# Altium schematic symbol library lib_datalogger.SchLib: 1246 symbols (part 2 of 16)
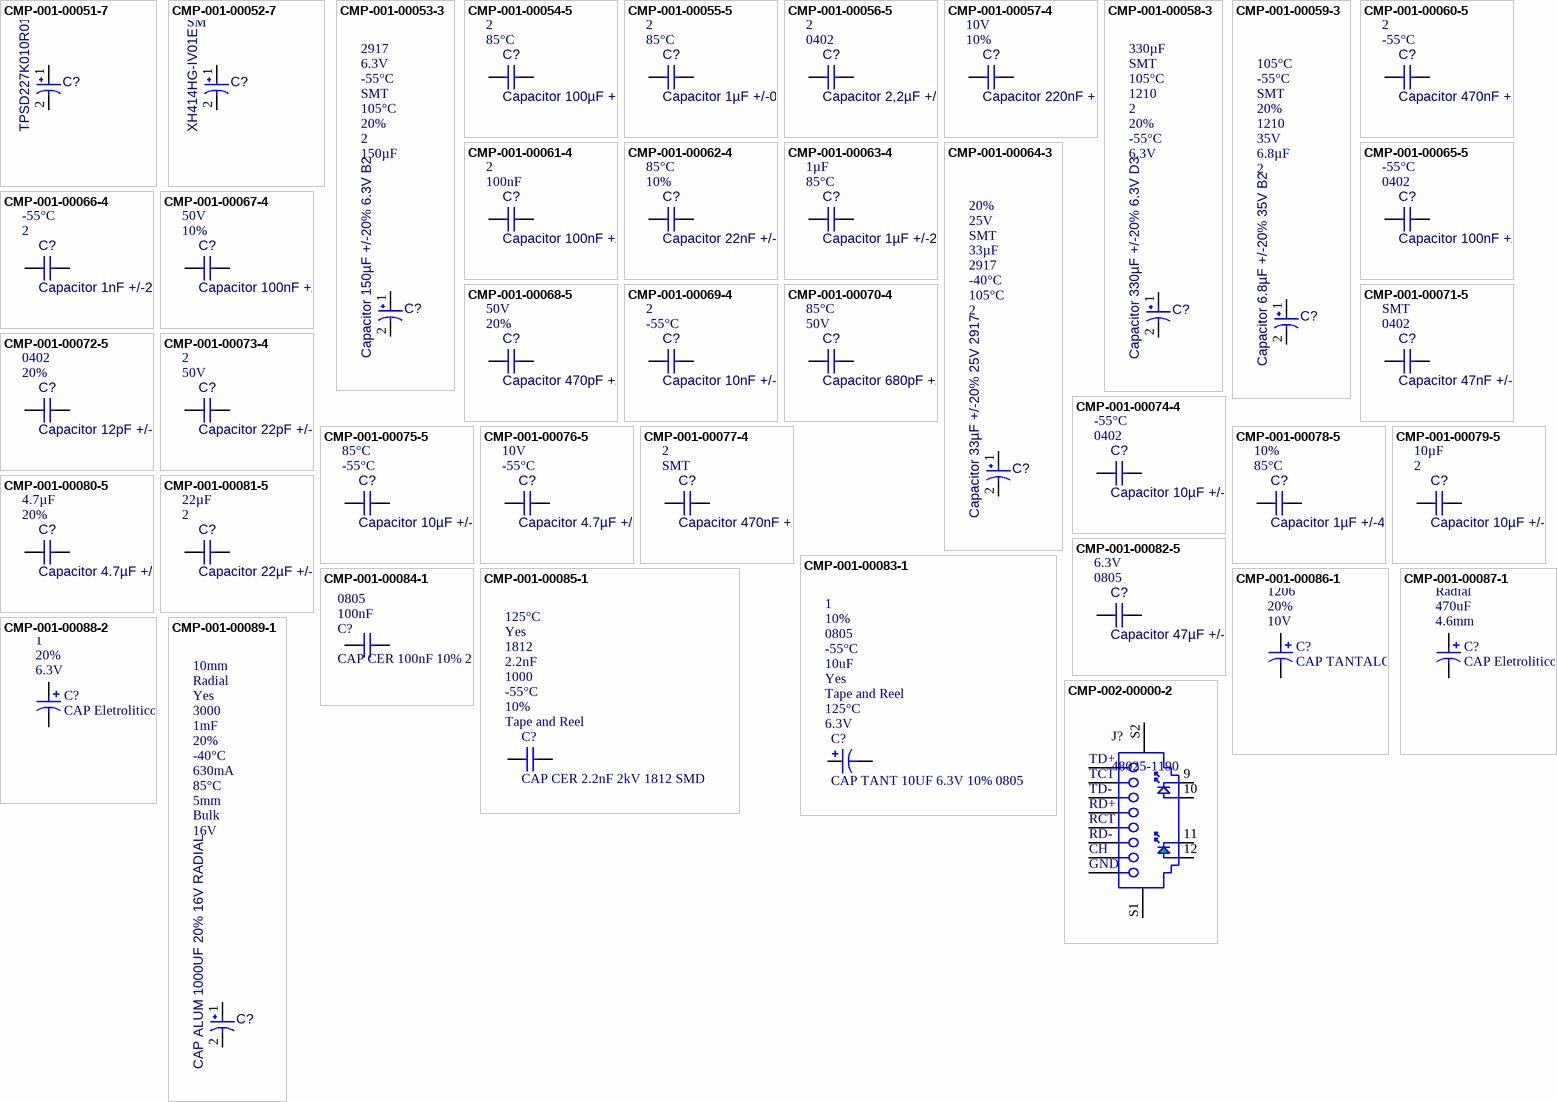
[diagram p44: symbols CMP-001-00051-7 to CMP-002-00000-2]

## CMP-001-00053-3
designator C?, comment Capacitor 150µF +/-20% 6.3V B2  value 150µF  Pins: 2  Tolerance: 20%  Max Operating Temperature: 105°C  Mounting Technology: SMT  Min Operating Temperature: -55°C  Voltage Rating: 6.3V  Case/Package: 2917
Molded Tantalum Polymer Capacitor, 150 uF, +/- 20%, 6.3 V, -55 to 105 degC, 2-Pin SMD, RoHS, Tape and Reel
footprint EEF-CX1E330R-Footprint-1
footprint PNSC-6TPE150MAZB_L (Molded Capacitor, 2-Leads, Body 3.70x3mm, IPC High Density)
pins: 1, 2

## CMP-001-00054-5
designator C?, comment Capacitor 100µF +/-20% 6.3V 0805  value 100µF  Max Operating Temperature: 85°C  Pins: 2  Tolerance: 10%  Min Operating Temperature: -55°C  Case/Package: 0805  Voltage Rating: 6.3V  Mounting Technology: SMT
Chip Capacitor, 100µF +/-20%, 6.3V, 0805, Thickness 1.45 mm
footprint CAPC0603(1608)100_L (Chip Capacitor, Body 1.6x0.8mm, Height 1.0mm, IPC High Density)
footprint CAPC0805(2012)145_L (Chip Capacitor, Body 2.0x1.2mm, Height 1.45mm, IPC High Density)
pins: 1, 2

## CMP-001-00055-5
designator C?, comment Capacitor 1µF +/-0.1% 25V 0603  value 1µF  Max Operating Temperature: 85°C  Pins: 2  Tolerance: 20%  Case/Package: 0603  Voltage Rating: 25V  Min Operating Temperature: -55°C  Mounting Technology: SMT
Chip Capacitor, 1µF +/-0.1%, 25V, 0603, Thickness 1 mm
footprint CAPC0603(1608)100_L (Chip Capacitor, Body 1.6x0.8mm, Height 1.0mm, IPC High Density)
footprint CAPC0603(1608)100_L (Chip Capacitor, Body 1.6x0.8mm, Height 1.0mm, IPC High Density)
pins: 1, 2

## CMP-001-00056-5
designator C?, comment Capacitor 2,2µF +/-20% 10V 0402  value 2.2µF  Case/Package: 0402  Pins: 2  Voltage Rating: 10V  Mounting Technology: SMT  Tolerance: 10%  Max Operating Temperature: 85°C  Min Operating Temperature: -55°C
Chip Capacitor, 2,2µF +/-20%, 10V, 0402, Thickness 0.6 mm
footprint CAPC0603(1608)100_L (Chip Capacitor, Body 1.6x0.8mm, Height 1.0mm, IPC High Density)
footprint CAPC0402(1005)60_L (Chip Capacitor, Body 1.0x0.5mm, Height 0.6mm, IPC High Density)
pins: 1, 2

## CMP-001-00057-4
designator C?, comment Capacitor 220nF +/-20% 10V 0402  value 220nF  Tolerance: 10%  Voltage Rating: 10V  Mounting Technology: SMT  Case/Package: 0402  Max Operating Temperature: 85°C  Min Operating Temperature: -55°C  Pins: 2
Chip Capacitor, 220nF +/-20%, 10V, 0402, Thickness 0.6 mm
footprint CAPC0603(1608)100_L (Chip Capacitor, Body 1.6x0.8mm, Height 1.0mm, IPC High Density)
footprint CAPC0402(1005)60_L (Chip Capacitor, Body 1.0x0.5mm, Height 0.6mm, IPC High Density)
pins: 1, 2

## CMP-001-00058-3
designator C?, comment Capacitor 330µF +/-20% 6.3V D3  value 330µF  Voltage Rating: 6.3V  Min Operating Temperature: -55°C  Tolerance: 20%  Pins: 2  Case/Package: 1210  Max Operating Temperature: 105°C  Mounting Technology: SMT
Molded Tantalum Polymer Capacitor, 330 uF, +/- 20%, 6.3 V, -55 to 105 degC, 2-Pin SMD, RoHS, Tape and Reel
footprint EEF-CX1E330R-Footprint-1
footprint PNSC-6TPF220M5L (Molded Capacitor, 2-Leads, Body 7.60x4.60mm, IPC High Density)
pins: 1, 2

## CMP-001-00059-3
designator C?, comment Capacitor 6.8µF +/-20% 35V B2  value 6.8µF  Pins: 2  Voltage Rating: 35V  Case/Package: 1210  Tolerance: 20%  Mounting Technology: SMT  Min Operating Temperature: -55°C  Max Operating Temperature: 105°C
Molded Tantalum Polymer Capacitor, 6.8 uF, +/- 20%, 35 V, -55 to 105 degC, 2-Pin SMD, RoHS, Tape and Reel
footprint EEF-CX1E330R-Footprint-1
footprint PNSC-6TPE150MAZB_L (Molded Capacitor, 2-Leads, Body 3.70x3mm, IPC High Density)
pins: 1, 2

## CMP-001-00060-5
designator C?, comment Capacitor 470nF +/-40% 10V 0402  value 470nF  Min Operating Temperature: -55°C  Pins: 2  Voltage Rating: 10V  Max Operating Temperature: 85°C  Mounting Technology: SMT  Case/Package: 0402  Tolerance: 20%
Chip Capacitor, 470nF +/-40%, 10V, 0402, Thickness 0.6 mm
footprint CAPC0603(1608)100_L (Chip Capacitor, Body 1.6x0.8mm, Height 1.0mm, IPC High Density)
footprint CAPC0402(1005)60_L (Chip Capacitor, Body 1.0x0.5mm, Height 0.6mm, IPC High Density)
pins: 1, 2

## CMP-001-00061-4
designator C?, comment Capacitor 100nF +/-20% 10V 0402  value 100nF  Pins: 2  Max Operating Temperature: 85°C  Case/Package: 0402  Tolerance: 20%  Min Operating Temperature: -55°C  Voltage Rating: 10V  Mounting Technology: SMT
Chip Capacitor, 100nF +/-20%, 10V, 0402, Thickness 0.6 mm
footprint CAPC0603(1608)100_L (Chip Capacitor, Body 1.6x0.8mm, Height 1.0mm, IPC High Density)
footprint CAPC0402(1005)60_L (Chip Capacitor, Body 1.0x0.5mm, Height 0.6mm, IPC High Density)
pins: 1, 2

## CMP-001-00062-4
designator C?, comment Capacitor 22nF +/-20% 10V 0402  value 22nF  Tolerance: 10%  Max Operating Temperature: 85°C  Mounting Technology: SMT  Voltage Rating: 10V  Pins: 2  Case/Package: 0402  Min Operating Temperature: -55°C
Chip Capacitor, 22nF +/-20%, 10V, 0402, Thickness 0.6 mm
footprint CAPC0603(1608)100_L (Chip Capacitor, Body 1.6x0.8mm, Height 1.0mm, IPC High Density)
footprint CAPC0402(1005)60_L (Chip Capacitor, Body 1.0x0.5mm, Height 0.6mm, IPC High Density)
pins: 1, 2

## CMP-001-00063-4
designator C?, comment Capacitor 1µF +/-20% 10V 0402  value 1µF  Max Operating Temperature: 85°C  Voltage Rating: 10V  Tolerance: 10%  Case/Package: 0402  Min Operating Temperature: -55°C  Pins: 2  Mounting Technology: SMT
Chip Capacitor, 1µF +/-20%, 10V, 0402, Thickness 0.6 mm
footprint CAPC0603(1608)100_L (Chip Capacitor, Body 1.6x0.8mm, Height 1.0mm, IPC High Density)
footprint CAPC0402(1005)60_L (Chip Capacitor, Body 1.0x0.5mm, Height 0.6mm, IPC High Density)
pins: 1, 2

## CMP-001-00064-3
designator C?, comment Capacitor 33µF +/-20% 25V 2917  value 33µF  Pins: 2  Max Operating Temperature: 105°C  Min Operating Temperature: -40°C  Case/Package: 2917  Mounting Technology: SMT  Voltage Rating: 25V  Tolerance: 20%
Aluminum Organic Polymer Capacitors 33uF 25volt SP-Cap AEC-Q200
footprint EEF-CX1E330R-Footprint-1
footprint EEF-CX1E330R-Footprint-1
pins: 1, 2

## CMP-001-00065-5
designator C?, comment Capacitor 100nF +/-20% 25V 0402  value 100nF  Case/Package: 0402  Min Operating Temperature: -55°C  Max Operating Temperature: 85°C  Pins: 2  Voltage Rating: 25V  Tolerance: 10%  Mounting Technology: SMT
Chip Capacitor, 100nF +/-20%, 25V, 0402, Thickness 0.6 mm
footprint CAPC0603(1608)100_L (Chip Capacitor, Body 1.6x0.8mm, Height 1.0mm, IPC High Density)
footprint CAPC0402(1005)60_L (Chip Capacitor, Body 1.0x0.5mm, Height 0.6mm, IPC High Density)
pins: 1, 2

## CMP-001-00066-4
designator C?, comment Capacitor 1nF +/-20% 50V 0402  value 1nF  Pins: 2  Min Operating Temperature: -55°C  Case/Package: 0402  Voltage Rating: 50V  Tolerance: 10%  Max Operating Temperature: 85°C  Mounting Technology: SMT
Chip Capacitor, 1nF +/-20%, 50V, 0402, Thickness 0.33 mm
footprint CAPC0603(1608)100_L (Chip Capacitor, Body 1.6x0.8mm, Height 1.0mm, IPC High Density)
footprint CAPC0402(1005)33_L (Chip Capacitor, Body 1.0x0.5mm, Height 0.33mm, IPC High Density)
pins: 1, 2

## CMP-001-00067-4
designator C?, comment Capacitor 100nF +/-20% 50V 0402  value 100nF  Tolerance: 10%  Voltage Rating: 50V  Max Operating Temperature: 85°C  Case/Package: 0402  Pins: 2  Min Operating Temperature: -55°C  Mounting Technology: SMT
Chip Capacitor, 100nF +/-20%, 50V, 0402, Thickness 0.6 mm
footprint CAPC0603(1608)100_L (Chip Capacitor, Body 1.6x0.8mm, Height 1.0mm, IPC High Density)
footprint CAPC0402(1005)60_L (Chip Capacitor, Body 1.0x0.5mm, Height 0.6mm, IPC High Density)
pins: 1, 2

## CMP-001-00068-5
designator C?, comment Capacitor 470pF +/-20% 50V 0402  value 470pF  Tolerance: 20%  Voltage Rating: 50V  Case/Package: 0402  Max Operating Temperature: 85°C  Min Operating Temperature: -55°C  Pins: 2  Mounting Technology: SMT
Chip Capacitor, 470pF +/-20%, 50V, 0402, Thickness 0.6 mm
footprint CAPC0603(1608)100_L (Chip Capacitor, Body 1.6x0.8mm, Height 1.0mm, IPC High Density)
footprint CAPC0402(1005)60_L (Chip Capacitor, Body 1.0x0.5mm, Height 0.6mm, IPC High Density)
pins: 1, 2

## CMP-001-00069-4
designator C?, comment Capacitor 10nF +/-20% 50V 0402  value 10nF  Min Operating Temperature: -55°C  Pins: 2  Mounting Technology: SMT  Case/Package: 0402  Tolerance: 5%  Voltage Rating: 50V  Max Operating Temperature: 85°C
Chip Capacitor, 10nF +/-20%, 50V, 0402, Thickness 0.6 mm
footprint CAPC0603(1608)100_L (Chip Capacitor, Body 1.6x0.8mm, Height 1.0mm, IPC High Density)
footprint CAPC0402(1005)60_L (Chip Capacitor, Body 1.0x0.5mm, Height 0.6mm, IPC High Density)
pins: 1, 2

## CMP-001-00070-4
designator C?, comment Capacitor 680pF +/-20% 50V 0402  value 680pF  Voltage Rating: 50V  Max Operating Temperature: 85°C  Mounting Technology: SMT  Case/Package: 0402  Tolerance: 10%  Min Operating Temperature: -55°C  Pins: 2
Chip Capacitor, 680pF +/-20%, 50V, 0402, Thickness 0.33 mm
footprint CAPC0603(1608)100_L (Chip Capacitor, Body 1.6x0.8mm, Height 1.0mm, IPC High Density)
footprint CAPC0402(1005)33_L (Chip Capacitor, Body 1.0x0.5mm, Height 0.33mm, IPC High Density)
pins: 1, 2

## CMP-001-00071-5
designator C?, comment Capacitor 47nF +/-20% 50V 0402  value 47nF  Case/Package: 0402  Mounting Technology: SMT  Tolerance: 20%  Pins: 2  Voltage Rating: 50V  Min Operating Temperature: -55°C  Max Operating Temperature: 85°C
Chip Capacitor, 47nF +/-20%, 50V, 0402, Thickness 0.6 mm
footprint CAPC0603(1608)100_L (Chip Capacitor, Body 1.6x0.8mm, Height 1.0mm, IPC High Density)
footprint CAPC0402(1005)60_L (Chip Capacitor, Body 1.0x0.5mm, Height 0.6mm, IPC High Density)
pins: 1, 2

## CMP-001-00072-5
designator C?, comment Capacitor 12pF +/-10% 50V 0402  value 12pF  Tolerance: 20%  Case/Package: 0402  Max Operating Temperature: 85°C  Pins: 2  Voltage Rating: 50V  Min Operating Temperature: -55°C  Mounting Technology: SMT
Chip Capacitor, 12pF +/-10%, 50V, 0402, Thickness 0.33 mm
footprint CAPC0603(1608)100_L (Chip Capacitor, Body 1.6x0.8mm, Height 1.0mm, IPC High Density)
footprint CAPC0402(1005)33_L (Chip Capacitor, Body 1.0x0.5mm, Height 0.33mm, IPC High Density)
pins: 1, 2

## CMP-001-00073-4
designator C?, comment Capacitor 22pF +/-10% 50V 0402  value 22pF  Voltage Rating: 50V  Pins: 2  Tolerance: 10%  Min Operating Temperature: -55°C  Case/Package: 0402  Mounting Technology: SMT  Max Operating Temperature: 85°C
Chip Capacitor, 22pF +/-10%, 50V, 0402, Thickness 0.6 mm
footprint CAPC0603(1608)100_L (Chip Capacitor, Body 1.6x0.8mm, Height 1.0mm, IPC High Density)
footprint CAPC0402(1005)60_L (Chip Capacitor, Body 1.0x0.5mm, Height 0.6mm, IPC High Density)
pins: 1, 2

## CMP-001-00074-4
designator C?, comment Capacitor 10µF +/-40% 6.3V 0402  value 10µF  Case/Package: 0402  Min Operating Temperature: -55°C  Mounting Technology: SMT  Tolerance: 10%  Voltage Rating: 6.3V  Pins: 2  Max Operating Temperature: 85°C
Chip Capacitor, 10µF +/-40%, 6.3V, 0402, Thickness 0.6 mm
footprint CAPC0603(1608)100_L (Chip Capacitor, Body 1.6x0.8mm, Height 1.0mm, IPC High Density)
footprint CAPC0402(1005)60_L (Chip Capacitor, Body 1.0x0.5mm, Height 0.6mm, IPC High Density)
pins: 1, 2

## CMP-001-00075-5
designator C?, comment Capacitor 10µF +/-20% 10V 0603  value 10µF  Min Operating Temperature: -55°C  Max Operating Temperature: 85°C  Mounting Technology: SMT  Case/Package: 0603  Pins: 2  Tolerance: 10%  Voltage Rating: 10V
Chip Capacitor, 10µF +/-20%, 10V, 0603, Thickness 1 mm
footprint CAPC0603(1608)100_L (Chip Capacitor, Body 1.6x0.8mm, Height 1.0mm, IPC High Density)
footprint CAPC0603(1608)100_L (Chip Capacitor, Body 1.6x0.8mm, Height 1.0mm, IPC High Density)
pins: 1, 2

## CMP-001-00076-5
designator C?, comment Capacitor 4.7µF +/-20% 10V 0603  value 4.7µF  Min Operating Temperature: -55°C  Voltage Rating: 10V  Max Operating Temperature: 85°C  Mounting Technology: SMT  Tolerance: 10%  Case/Package: 0603  Pins: 2
Chip Capacitor, 4.7µF +/-20%, 10V, 0603, Thickness 1 mm
footprint CAPC0603(1608)100_L (Chip Capacitor, Body 1.6x0.8mm, Height 1.0mm, IPC High Density)
footprint CAPC0603(1608)100_L (Chip Capacitor, Body 1.6x0.8mm, Height 1.0mm, IPC High Density)
pins: 1, 2

## CMP-001-00077-4
designator C?, comment Capacitor 470nF +/-20% 25V 0603  value 470nF  Mounting Technology: SMT  Pins: 2  Voltage Rating: 25V  Min Operating Temperature: -55°C  Tolerance: 10%  Case/Package: 0603  Max Operating Temperature: 85°C
Chip Capacitor, 470nF +/-20%, 25V, 0603, Thickness 1 mm
footprint CAPC0603(1608)100_L (Chip Capacitor, Body 1.6x0.8mm, Height 1.0mm, IPC High Density)
footprint CAPC0603(1608)100_L (Chip Capacitor, Body 1.6x0.8mm, Height 1.0mm, IPC High Density)
pins: 1, 2

## CMP-001-00078-5
designator C?, comment Capacitor 1µF +/-40% 50V 0603  value 1µF  Max Operating Temperature: 85°C  Tolerance: 10%  Case/Package: 0603  Pins: 2  Mounting Technology: SMT  Voltage Rating: 50V  Min Operating Temperature: -55°C
Chip Capacitor, 1µF +/-40%, 50V, 0603, Thickness 1 mm
footprint CAPC0603(1608)100_L (Chip Capacitor, Body 1.6x0.8mm, Height 1.0mm, IPC High Density)
footprint CAPC0603(1608)100_L (Chip Capacitor, Body 1.6x0.8mm, Height 1.0mm, IPC High Density)
pins: 1, 2

## CMP-001-00079-5
designator C?, comment Capacitor 10µF +/-20% 25V 0805  value 10µF  Pins: 2  Case/Package: 0805  Max Operating Temperature: 85°C  Voltage Rating: 25V  Min Operating Temperature: -55°C  Tolerance: 10%  Mounting Technology: SMT
Chip Capacitor, 10µF +/-20%, 25V, 0805, Thickness 1.45 mm
footprint CAPC0603(1608)100_L (Chip Capacitor, Body 1.6x0.8mm, Height 1.0mm, IPC High Density)
footprint CAPC0805(2012)145_L (Chip Capacitor, Body 2.0x1.2mm, Height 1.45mm, IPC High Density)
pins: 1, 2

## CMP-001-00080-5
designator C?, comment Capacitor 4.7µF +/-40% 25V 0805  value 4.7µF  Tolerance: 20%  Max Operating Temperature: 85°C  Mounting Technology: SMT  Pins: 2  Voltage Rating: 25V  Min Operating Temperature: -55°C  Case/Package: 0805
Chip Capacitor, 4.7µF +/-40%, 25V, 0805, Thickness 1.45 mm
footprint CAPC0603(1608)100_L (Chip Capacitor, Body 1.6x0.8mm, Height 1.0mm, IPC High Density)
footprint CAPC0805(2012)145_L (Chip Capacitor, Body 2.0x1.2mm, Height 1.45mm, IPC High Density)
pins: 1, 2

## CMP-001-00081-5
designator C?, comment Capacitor 22µF +/-40% 16V 0805  value 22µF  Pins: 2  Tolerance: 5%  Voltage Rating: 16V  Case/Package: 0805  Mounting Technology: SMT  Min Operating Temperature: -55°C  Max Operating Temperature: 85°C
Chip Capacitor, 22µF +/-40%, 16V, 0805, Thickness 1.45 mm
footprint CAPC0603(1608)100_L (Chip Capacitor, Body 1.6x0.8mm, Height 1.0mm, IPC High Density)
footprint CAPC0805(2012)145_L (Chip Capacitor, Body 2.0x1.2mm, Height 1.45mm, IPC High Density)
pins: 1, 2

## CMP-001-00082-5
designator C?, comment Capacitor 47µF +/-40% 6.3V 0805  value 47µF  Case/Package: 0805  Voltage Rating: 6.3V  Pins: 2  Min Operating Temperature: -55°C  Mounting Technology: SMT  Tolerance: 10%  Max Operating Temperature: 85°C
Chip Capacitor, 47µF +/-40%, 6.3V, 0805, Thickness 1.45 mm
footprint CAPC0603(1608)100_L (Chip Capacitor, Body 1.6x0.8mm, Height 1.0mm, IPC High Density)
footprint CAPC0805(2012)145_L (Chip Capacitor, Body 2.0x1.2mm, Height 1.45mm, IPC High Density)
pins: 1, 2

## CMP-001-00083-1
designator C?, comment CAP TANT 10UF 6.3V 10% 0805  Voltage Rating: 6.3V  Max Operating Temperature: 125°C  Packaging: Tape and Reel  RoHS Compliant: Yes  Capacitance: 10uF  Min Operating Temperature: -55°C  Case/Package: 0805  Tolerance: 10%  Package Quantity: 1
Cap Tant Solid 10uF 6.3V R CASE 10% (2.05 X 1.3 X 1.2mm) SMD 2012-12 1 Ohm 125AHA T/R; Dissipation Factor: 8%; Dielectric Material: Tantalum; ESR (Equivalent Series Resistance): 1R; Polarity: Polar; Features: General Purpose; Height: 1.2mm; Termination: SMD/SMT; Radiation Hardening: No; Length: 2.05mm; Mount: Surface Mount; Width: 0.051inch; Case Code (Metric): 2012; Lead Free: Lead Free; REACH SVHC: No SVHC; Height - Seated (Max): 0.047inch; Case Code (Imperial): 0805; Depth: 1.3mm
footprint CAP TANT CASE R 0805 (0.081" L x 0.051" W (2.05mm x 1.30mm))
footprint CAP TANT CASE R 0805 (0.081" L x 0.051" W (2.05mm x 1.30mm))
pins: 1, 2

## CMP-001-00084-1
designator C?, comment CAP CER 100nF 10% 25V 0805 SMD  Capacitance: 100nF  Case/Package: 0805  Max Operating Temperature: 125°C  Packaging: Tape and Reel  Min Operating Temperature: -55°C  RoHS Compliant: Yes  Voltage Rating: 25V  Tolerance: 10%  Package Quantity: 1
0805 100 nF 25V ±10 % Tolerance X7R Surface Mount Multilayer Ceramic Capacitor; Insulation Resistance: 100GR; Dissipation Factor: 3%; Dielectric: X7R; Construction: Flat; Thickness: 0.037inch; Case Code (Imperial): 0805; Length: 2.01mm; Termination: SMD/SMT; Series: -; REACH SVHC: No SVHC; Width: 0.049inch; Mount: Surface Mount,PCB; Radiation Hardening: No; Voltage Rating (DC): 25V; Lead Free: Lead Free; Case Code (Metric): 2012; Voltage: 25V; Height: 0.94mm; Number of Pins: 2; Depth: 1.25mm; Contact Plating: Tin,Matte
footprint CC2012-0805 (Chip Capacitor)
footprint CAPC2013X94X50ML20T25 (Chip Capacitor, 2-Leads, Body 2.01x1.25mm, IPC Low Density)
footprint CAPC2013X94X50LL20T25 (Chip Capacitor, 2-Leads, Body 2.01x1.25mm, IPC High Density)
footprint CAPC2013X94X50NL20T25 (Chip Capacitor, 2-Leads, Body 2.01x1.25mm, IPC Medium Density)
pins: 1, 2

## CMP-001-00085-1
designator C?, comment CAP CER 2.2nF 2kV 1812 SMD  Packaging: Tape and Reel  Tolerance: 10%  Min Operating Temperature: -55°C  Package Quantity: 1000  Capacitance: 2.2nF  Case/Package: 1812  RoHS Compliant: Yes  Max Operating Temperature: 125°C
Cap Ceramic 0.0022uF 2000V X7R 10% SMD 1812 125°C T/R; Termination: SMD/SMT; Length: 4.5mm; Voltage Rating (DC): 2kV; Case Code (Imperial): 1812; Case Code (Metric): 4532; Width: 3.2mm; Dielectric: X7R
footprint CC1005-0402 (Chip Capacitor; Body 0.039" L x 0.020" W (1.00mm x 0.50mm))
footprint C1812C222KGRACAUTO-Footprint-1
pins: 1, 2

## CMP-001-00086-1
designator C?, comment CAP TANTALO 10uF 10V 20% 1206 SMD  Voltage Rating: 10V  Tolerance: 20%  Case/Package: 1206  Packaging: Tape and Reel  Max Operating Temperature: 125°C  Min Operating Temperature: -55°C  Capacitance: 10uF  RoHS Compliant: Yes  Package Quantity: 1
CAP TANTALO 10uF, 10V, 20%, 1206 SMD; Manufacturer Part Number: TCA1A106M8R; ESR (Equivalent Series Resistance): 3R; Series: TC; Mount: Surface Mount; Case Code (Imperial): 1206; Height: 1.6mm; Radiation Hardening: No; Voltage Rating (DC): 10V; Width: 0.063inch; Construction: Flat; Depth: 1.6mm; Length: 0.126inch; Height - Seated (Max): 0.071inch; Lead Free: Lead Free; Case Code (Metric): 3216; Features: General Purpose
footprint CAP_SMD_D100_P46_H120
footprint CC TANT 1206
pins: 1, 2
1 alternate drawing of the same symbol

## CMP-001-00087-1
designator C?, comment CAP Eletrolitico 470uF 25V 20% VS SMD Can Radial  Lead Pitch: 4.6mm  Capacitance: 470uF  Case/Package: Radial  RoHS Compliant: Yes  Ripple Current: 380mA  Max Operating Temperature: 85°C  Package Quantity: 1  Tolerance: 20%  Min Operating Temperature: -40°C  Voltage Rating: 25V  Diameter: 10mm  Packaging: Tape and Reel
Cap Eletrolitico 470uF 25V 20% 380mA (10 X 10.2mm) SMD; Manufacturer Part Number: EEE-1EA471UAP; Life (Hours): 1000Hour; Lead Diameter: 0.9mm; Leakage Current: 3uA; Dissipation Factor: 0.25%; Series: S; Height - Seated (Max): 0.402inch; Height: 10.2mm; Length: 10.5mm; Voltage: 25V; Construction: Cylindrical; Lead Free: Lead Free; Ripple Current (AC): 380mA; Radiation Hardening: No; REACH SVHC: No SVHC; Contact Plating: Tin; Voltage Rating (DC): 25V; Mount: Surface Mount,PCB; Termination: SMD/SMT
footprint CAP_SMD_D100_P46_H120
footprint CAP_SMD_D10
pins: 1, 2
1 alternate drawing of the same symbol

## CMP-001-00088-2
designator C?, comment CAP Eletrolitico 22uF 6.3V 20% SMD  Voltage Rating: 6.3V  Tolerance: 20%  Package Quantity: 1  Min Operating Temperature: -40°C  Max Operating Temperature: 105°C  Lead Pitch: 1mm  Ripple Current (AC): 26mA  Diameter: 4mm  RoHS Compliant: Yes  Case/Package: Radial  Capacitance: 22uF  Packaging: Tape and Reel
Cap Aluminum 22uF 6.3V 20% (4 X 5.8mm) SMD 26mA 2000 hr 105°C T/R; Manufacturer Part Number: EEE-HB0J220R; Lead Length: 1.8mm; Leakage Current: 3uA; Dielectric Material: Aluminium; Life (Hours): 2000Hour; Polarity: Polar; REACH SVHC: No SVHC; Construction: Cylindrical; Height - Seated (Max): 0.228inch; Lead Free: Lead Free; Number of Pins: 2; Voltage Rating (DC): 6.3V; Contact Plating: Tin; Ripple Current: 26mA; Series: HB; Termination: SMD/SMT; Voltage: 6.3V; Length: 5.5mm; Height: 5.8mm; Width: 4.3mm; Radiation Hardening: No; Mount: Surface Mount,PCB
footprint CAP_SMD_D100_P46_H120
footprint CAP_SMD_D4
pins: 1, 2
1 alternate drawing of the same symbol

## CMP-001-00089-1
designator C?, comment CAP ALUM 1000UF 20% 16V RADIAL  Voltage Rating: 16V  Packaging: Bulk  Lead Pitch: 5mm  Max Operating Temperature: 85°C  Ripple Current: 630mA  Min Operating Temperature: -40°C  Tolerance: 20%  Capacitance: 1mF  Package Quantity: 3000  RoHS Compliant: Yes  Case/Package: Radial  Diameter: 10mm
Lead Length: 20mm; Dissipation Factor: 0.16%; Leakage Current: 160uA; Dielectric Material: Aluminium; Lead Diameter: 0.6mm; Life (Hours): 2000Hour; Lead/Base Style: Straight; Height - Seated (Max): 0.669inch; Radiation Hardening: No; REACH SVHC: No SVHC; Voltage Rating (DC): 16V; Mount: Through Hole,PCB; Voltage: 16V; Height: 15mm; Termination: Radial; Series: ESK; Length: 15mm
footprint EEF-CX1E330R-Footprint-1
footprint CAP ALUM 1000UF 20% 16V RADIAL-Footprint-1
pins: 1, 2

## CMP-002-00000-2
designator J?, comment 48025-1190
Modular Jack with Integrated Magnetics with LED, 1.5 A, -40 to 70 degC, 12-Pin THD, RoHS, Tray; Manufacturer: Molex; Shielding: Shielded; Max Voltage Rating (AC): 150V; Capacitance: -45f; Gender: Female; Current Rating: 1.5A; Packaging: Tray; Package Quantity: 1080; RoHS Compliant: True; Contact Plating: Gold; Package Description: 12-Pin Through Hole Device, Body 16.2 x 25.4 mm; Min Operating Temperature: -40°C; Manufacturer URL: http://www.molex.com/; Package Reference: 48025-1190; Max Operating Temperature: 70°C; Pins: 8; Datasheet URL: http://www.molex.com/pdm_docs/sd/480251190_sd.pdf; Datasheet Version: Rev. G, 01/2012; Housing Material: Nylon; Case/Package: 48025-1190; Lead Pitch: 1.27mm; Voltage Rating: 150V; Connector Type: Modular; Contact Material: Brass; Mounting Technology: TH
footprint MOLX-48025-1190_V (Connector, 12-Leads, Body 16.2x25.4mm)
pins: 1 TD+, 2 TCT, 3 TD-, 4 RD+, 5 RCT, 6 RD-, 7 CHASSIS, 8 GND, 9, 10, 11, 12, S1, S2
text: CH

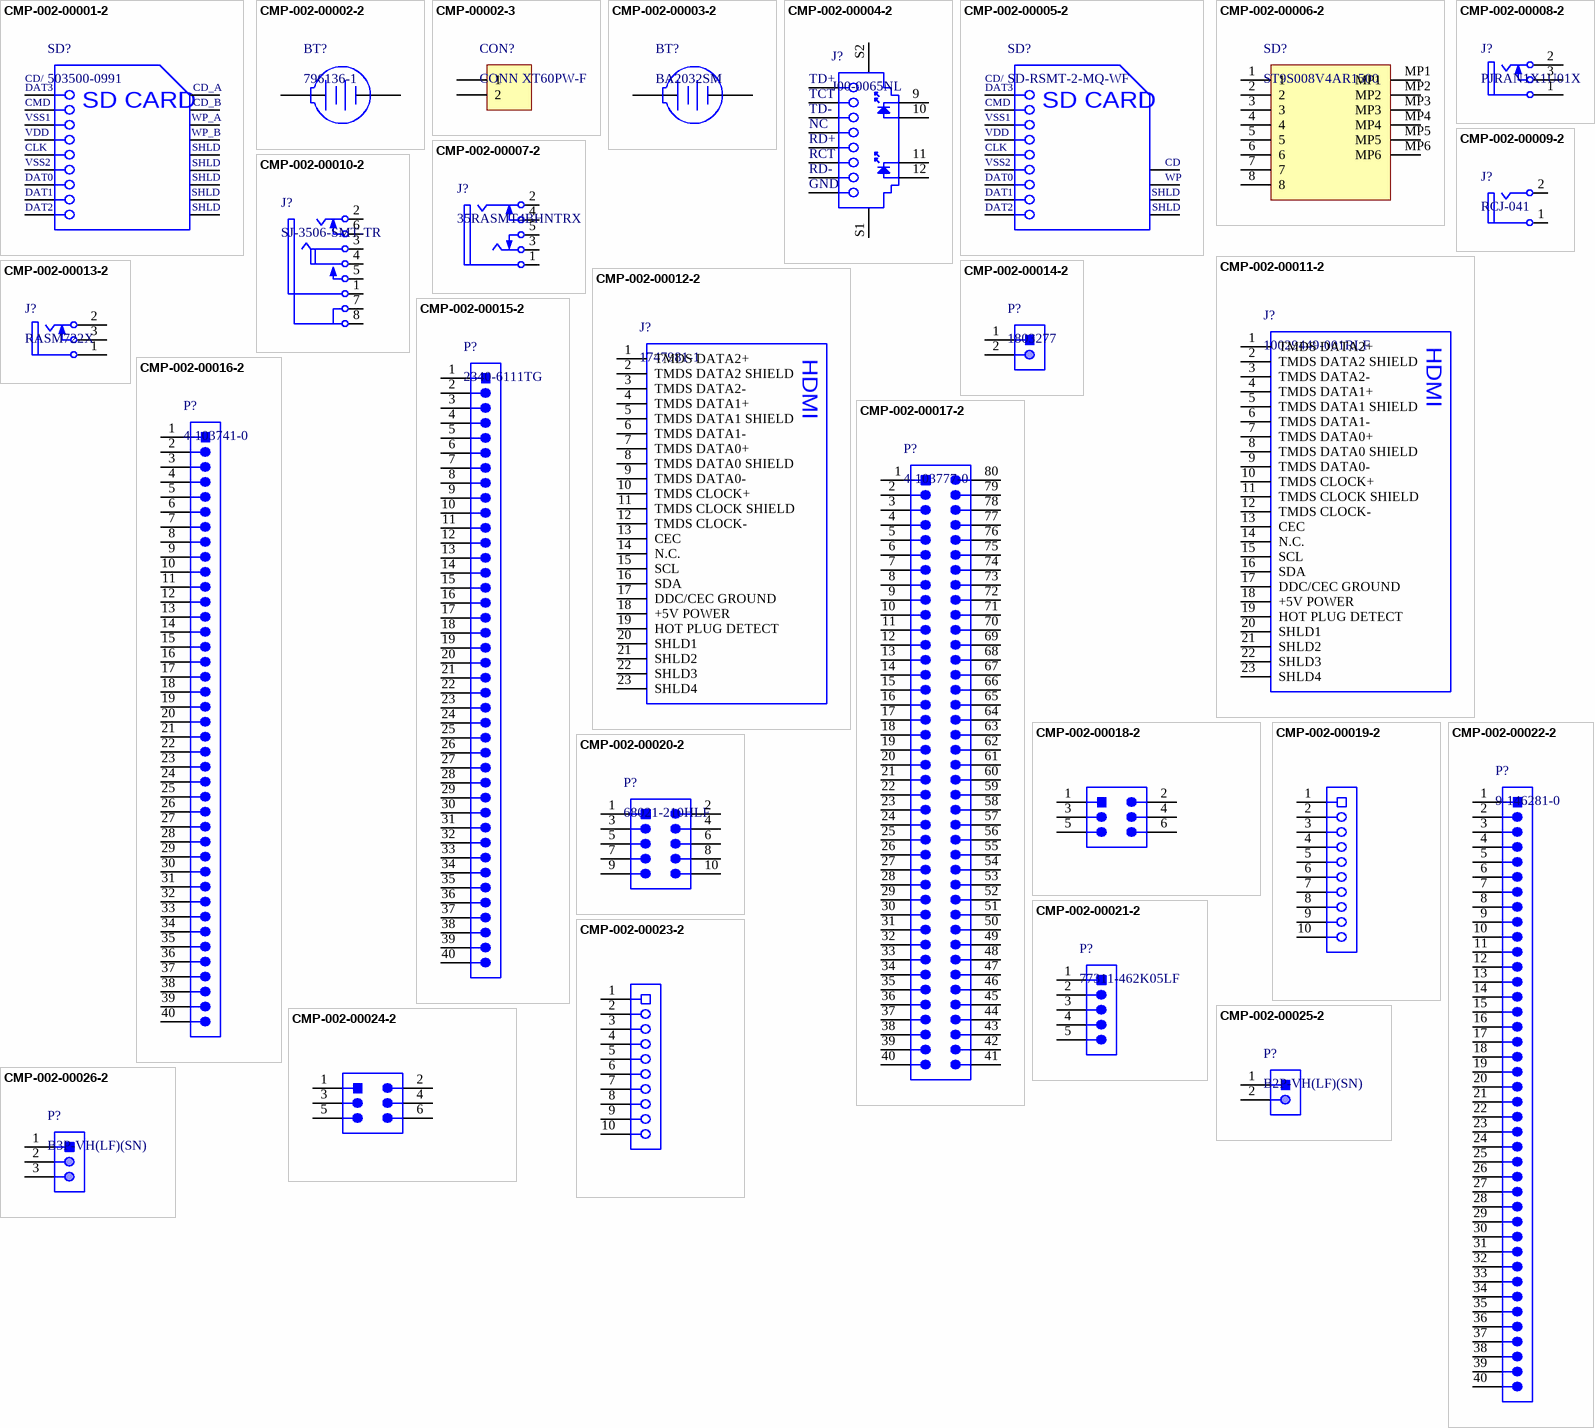
[diagram p3: symbols CMP-002-00001-2 to CMP-002-00026-2]

## CMP-002-00001-2
designator SD?, comment 503500-0991
SD and Combo Memory Card Connector, Pitch 2.5 mm, 1 x 6 Position, -25 to 85 degC, RoHS, Tape and Reel; Manufacturer: Molex; Current Rating: 500mA; Connector Type: SDCard; Voltage Rating (AC): 50V; Package Reference: 503500-0991; Pins: 9; Max Operating Temperature: 85°C; Manufacturer URL: http://www.molex.com/; Case/Package: 503500-0991; Mounting Technology: SM; Contact Plating: Gold; Datasheet URL: http://www.molex.com/pdm_docs/sd/5035000991_sd.pdf; Contact Finish: Gold; Contact Material: Copper; Lead Pitch: 2.5mm; Min Operating Temperature: -25°C; Datasheet Version: Rev. B, 02/2010; Package Quantity: 500; RoHS Compliant: True; Package Description: SD Card Connector, 9 Position Surface Mount, Length 28.6 mm, Height 3.1 mm; Packaging: TapeandReel
footprint MOLX-503500-0991_V (SD Card, 9-Leads, Body 28.6x27.8mm)
pins: 1 CD/DAT3, 2 CMD, 3 VSS1, 4 VDD, 5 CLK, 6 VSS2, 7 DAT0, 8 DAT1, 9 DAT2, 10 CD_A, 11 CD_B, 12 WP_A, 13 WP_B, 14 SHLD1, 15 SHLD2, 16 SHLD3, 17 SHLD4, 18 SHLD5
text: CD/; DAT3; SD CARD; SHLD

## CMP-002-00002-2
designator BT?, comment 796136-1
Battery Connector, 1 Cell, CR2032, 2-Pin SMD, RoHS, Tape and Reel; Manufacturer: TE Connectivity; Max Voltage Rating (AC): 30V; Connector Type: BatteryHolder; Batteries: 1; Datasheet URL: http://www.te.com/commerce/DocumentDelivery/DDEController?Action=srchrtrv&DocNm=796136&DocType=Customer+Drawing&DocLang=English&DocFormat=pdf&PartCntxt=796136-1; Contact Plating: Tin; Case/Package: 796136-1; Colour: Black; Package Reference: 796136-1; Package Quantity: 400; Pins: 2; Mounting Technology: SM; RoHS Compliant: True; Datasheet Version: Dec-13; Package Description: 2-Pin Surface Mount Device, Body 32.31 x 19.05 mm; Packaging: TapeandReel; Manufacturer URL: http://www.te.com/; Contact Material: Bronze
footprint TECO-796136-1_V (SMD, 2-Leads, Body 32.31x19.05mm)
pins: 1 +, 2 -

## CMP-00002-3
designator CON?, comment CONN XT60PW-F
Conector XT60PW-F.; Manufacturer 1: AMASS; Voltage: 500V; Current: 30A; Supplier 1: Eletronic Components; Supplier Unit Price 1: 0,78; Manufacturer Part Number 1: XT60PW-F; Supplier Part Number 1: XT60PW-F
footprint New footprint 1
pins: 1 (power), 2

## CMP-002-00003-2
designator BT?, comment BA2032SM
Coin Cell Holder, 1 Cell, -40 to 225 degC, 2-Pin SMD, RoHS, Tray; Manufacturer: Memory Protection Devices; Connector Type: BatteryHolder; Package Quantity: 100; Package Description: 2-Pin Surface Mount Device, Body 28 x 16 mm; Datasheet Version: Rev. H, 03/2014; RoHS Compliant: True; Case/Package: BA2032SM; Mounting Technology: SM; Min Operating Temperature: -40°C; Package Reference: BA2032SM; Max Operating Temperature: 225°C; Datasheet URL: http://www.onlinecomponents.com/datasheet/ba2032sm.aspx?p=11910700
footprint MPD-BA2032SM_V (Coin Cell Holder, 2-Leads, Body 28x16mm)
pins: 1 +, 2 -

## CMP-002-00004-2
designator J?, comment J00-0065NL
1x1 Tab-Down RJ45, Pitch 1.27 mm, 8 Position, 0 to 70 degC, 8-Pin THD, RoHS, Bulk; Manufacturer: Pulse Electronics; Capacitance: -45f; Connector Type: SDCard; Gender: Female; Shielding: Shielded; Colour: Yellow; Manufacturer URL: http://www.pulseelectronics.com/; Pins: 8; Contact Plating: Gold; Min Operating Temperature: 0°C; Contact Material: Bronze; Datasheet URL: http://productfinder.pulseeng.com/products/datasheets/J403.pdf; Packaging: Bulk; Max Operating Temperature: 70°C; Package Description: 12-Pin Through Hole Device, Body 21.59 x 16.26 mm, Pitch 1.27 mm; Lead Pitch: 2.54mm; Datasheet Version: Aug-12; Package Reference: J00-0065NL; Case/Package: J00-0065NL; Package Quantity: 25; Mounting Technology: TH; Contact Finish: Gold; RoHS Compliant: True
footprint PULS-J00-006XNL-E_V (THD, 12-Leads, Body 21.59x16.26mm, Pitch 1.27mm)
pins: 1 TD+, 2 TCT, 3 TD-, 4 NC, 5 RD+, 6 RCT, 7 RD-, 8 GND, 9, 10, 11, 12, S1, S2

## CMP-002-00005-2
designator SD?, comment SD-RSMT-2-MQ-WF
3M(TM) Card Connector SD(TM), 9 Position, 0.5 A, 3.6 V, -25 to 85 degC, 9-Pin SMD, RoHS, Tape and Reel; Max Current Rating: 500mA; Connector Type: SDCard; Voltage Rating (AC): 6V; Datasheet URL: http://datasheet.octopart.com/SD-RSMT-2-MQ-WF-3M-datasheet-11778935.pdf; Datasheet Version: Nov-06; Package Quantity: 300; Manufacturer URL: http://www.3m.com/; Case/Package: SD-RSMT-2-MQ-WF-11; Package Description: 9-Pin Surface Mount Device, Body 30.5 x 28 mm; Package Reference: SD-RSMT-2-MQ-WF-11; Packaging: TapeandReel; Min Operating Temperature: -25°C; Contact Finish: Gold; Colour: Black; Lead Pitch: 2.5mm; Mounting Technology: SM; Max Operating Temperature: 85°C; RoHS Compliant: True; Manufacturer: 3M; Contact Material: Copper; Pins: 8; Current Rating: 500mA
footprint 3M-SD-RSMT-2-MQ-WF-11_V (SMD, 9-Leads, Body 30.5x28mm)
pins: 1 CD/DAT3, 2 CMD, 3 VSS1, 4 VDD, 5 CLK, 6 VSS2, 7 DAT0, 8 DAT1, 9 DAT2, 10 CD, 11 WP, 12 SHLD1, 13 SHLD2
text: CD/; DAT3; SD CARD; SHLD

## CMP-002-00006-2
designator SD?, comment ST9S008V4AR1500
Micro SD Memory Card Connector, 8 Position, 0.5 A, 10 V, -25 to 85 degC, 8-Pin SMD, RoHS, Tape and Reel; Manufacturer: JAE Electronics; Current Rating: 500mA; Gender: Male; Voltage Rating: 10V; Connector Type: SDCard; Mating Cycles: 10000; Package Version: Rev. 2, 12/2007; Package URL: https://datasheet.ciiva.com/683/sj108062-683405.pdf; Package Reference: ST9S008V4AR1500; Min Operating Temperature: -25°C; Manufacturer URL: http://www.jaeusa.com/; Lead Pitch: 1.1mm; Datasheet URL: http://jae-connector.com/en/pdf/MB-0177-1E_ST9.pdf; RoHS Compliant: True; Pins: 8; Package Quantity: 1500; Mounting Technology: SM; Contact Finish: Gold; Packaging: TapeandReel; Case/Package: ST9S008V4AR1500; Contact Plating: Gold; Package Description: 8-Pin Surface Mount Device, Body 15.2 x 13.7 mm, Pitch 1.1 mm; Max Operating Temperature: 85°C; Datasheet Version: Dec-08; Contact Material: Copper
footprint JAE-ST9S008V4AR1500_V (SD Card, 8-Leads, Body 15.2x13.7mm, Pitch 1.1mm)
pins: 1, 2, 3, 4, 5, 6, 7, 8, MP1, MP2, MP3, MP4, MP5, MP6

## CMP-002-00007-2
designator J?, comment 35RASMT4BHNTRX
Female 3.5 mm Phone Jack, 5 Position, Height 5 mm, RoHS, Tape and Reel; Manufacturer: Switchcraft; Shielding: Unshielded; Connector Type: Audio; Max Current Rating: 3A; Voltage Rating: 250V; Datasheet Version: Rev. C, 07/2014; Case/Package: 35RASMT4BHNTRX; Gender: Female; Package Description: Female 3.5 mm Phone Jack, 5 Position, Height 5 mm; Max Operating Temperature: 85°C; Colour: Black; Manufacturer URL: http://www.switchcraft.com/; Package Reference: 35RASMT4BHNTRX; Packaging: TapeandReel; Pins: 3; Mounting Technology: SM; Min Operating Temperature: -25°C; Contact Material: Copper; Datasheet URL: http://www.switchcraft.com/Drawings/35rasmt4bhntrx_cd.pdf; Contact Plating: Silver; Current Rating: 3A; RoHS Compliant: True; Package Quantity: 800
footprint SWIT-35RASMT4BHNTRX_V (Jack, 5-Leads, Body 17x6mm)
pins: 1, 2, 3, 4, 5

## CMP-002-00008-2
designator J?, comment PJRAN1X1U01X
Female Phono Jack, 3 Position, Height 13 mm, Tail Length 4 mm, RoHS, Bulk; Manufacturer: Switchcraft; Voltage Rating: 34V; Shielding: Unshielded; Current Rating: 2A; Connector Type: Audio; Min Operating Temperature: -25°C; Contact Plating: Silver; Manufacturer URL: http://www.switchcraft.com/; Pins: 1; RoHS Compliant: True; Package Reference: PJRAN1X1U01X; Datasheet Version: Rev. A, 01/2006; Package Description: Female Phono Jack, 3 Position, Height 13 mm, Tail Length 4 mm; Gender: Female; Max Operating Temperature: 85°C; Case/Package: Metal; Datasheet URL: http://www.conxall.com/Drawings/pjran1x1u__x_series_cd.pdf; Contact Material: Copper; Colour: Black; Max Current Rating: 2A; Mounting Technology: TH; Max Voltage Rating (DC): 34V; Package Quantity: 1
footprint SWIT-PJRAN1X1U01X_V (Jack, 3-Leads, Body 19.5x10mm)
pins: 1 SLEEVE, 2 TIP, 3 SHUNT

## CMP-002-00009-2
designator J?, comment RCJ-041
Female RCJ Jack, 2 Position, Height 11.724 mm, Tail Length 4 mm, RoHS, Bulk; Manufacturer: CUI Inc; Connector Type: Audio; Shielding: Unshielded; Housing Material: Plastic; Case/Package: RCJ-041; Min Operating Temperature: -20°C; Contact Material: Brass; Package Reference: RCJ-041; Packaging: Bulk; Package Quantity: 400; Datasheet Version: Rev. B, 02/2012; Manufacturer URL: http://www.cui.com/; Package Description: Female RCJ Jack, 2 Position, Height 11.724 mm, Tail Length 4 mm; RoHS Compliant: True; Datasheet URL: http://www.cui.com/product/resource/rcj-04x.pdf; Max Operating Temperature: 85°C; Gender: Female; Mounting Technology: TH
footprint CUI-RCJ-041_V (Jack, 2-Leads, Body 19.5x10mm)
pins: 1, 2

## CMP-002-00010-2
designator J?, comment SJ-3506-SMT-TR
Female Mid Mount Audio Jack, 6 Position, Height 2.55 mm, Tail Length 2 mm, -25 to 85 degC, RoHS, Tape and Reel; Manufacturer: CUI Inc; Current Rating: 1A; Shielding: Shielded; Max Operating Temperature: 85°C; Connector Type: Audio; Housing Material: Plastic; Datasheet Version: Rev. 1.01, 11/2012; Package Description: Female Mid Mount Audio Jack, 6 Position, Height 2.55 mm, Tail Length 2 mm; Datasheet URL: http://www.cui.com/product/resource/sj-3506-smt.pdf; Gender: Female; Mounting Technology: TH; Min Operating Temperature: -25°C; Contact Material: Brass; Package Reference: SJ-3506-SMT-TR; Case/Package: SJ-3506-SMT-TR; Manufacturer URL: http://www.cui.com/; Package Quantity: 500; Packaging: TapeandReel; RoHS Compliant: True
footprint CUI-SJ-3506-SMT-TR_V (Jack, 6-Leads, Body 15.4x12.8mm)
pins: 1 S "Sleeve", 2 T "Tip", 3 R "Ring", 4 IR "Isolated ring", 5 RN "Isolated ring switch (N-O)", 6 TN "Tip switch", 7 SHLD1 "Shield", 8 SHLD2 "Shield"

## CMP-002-00011-2
designator J?, comment 10029449-001RLF
Type A HDMI Receptacle without Flange, Pitch 0.5 mm, 19 Positions, -55 to 85 degC, RoHS, Tape and Reel; Manufacturer: FCI Electronics; Voltage Rating: 40V; Current Rating: 500mA; Gender: Female; Connector Type: Display; RoHS Compliant: True; Lead Pitch: 0.5mm; Case/Package: Metal; Datasheet Version: Rev. S, 06/2012; Datasheet URL: https://datasheet.ciiva.com/851/10029449-851120.pdf; Contact Material: Copper; Pins: 19; Packaging: TapeandReel; Package Reference: 10029449-001RLF; Colour: Black; Contact Plating: Gold; Package Description: 19-Pin Surface Mount Device, Body 15 x 9 mm, Pitch 0.5 mm; Mounting Technology: SM; Package Quantity: 400; Min Operating Temperature: -55°C; Manufacturer URL: http://portal.fciconnect.com/; Max Operating Temperature: 85°C
footprint FCI-10029449-001RLF_V (SMD, 19-Leads, Body 15x9mm, Pitch 0.5mm)
pins: 1 TMDS DATA2+, 2 TMDS DATA2 SHIELD, 3 TMDS DATA2-, 4 TMDS DATA1+, 5 TMDS DATA1 SHIELD, 6 TMDS DATA1-, 7 TMDS DATA0+, 8 TMDS DATA0 SHIELD, 9 TMDS DATA0-, 10 TMDS CLOCK+, 11 TMDS CLOCK SHIELD, 12 TMDS CLOCK-, 13 CEC, 14 N.C., 15 SCL, 16 SDA, 17 DDC/CEC GROUND, 18 +5V POWER, 19 HOT PLUG DETECT, 20 SHLD1, 21 SHLD2, 22 SHLD3, 23 SHLD4
text: HDMI

## CMP-002-00012-2
designator J?, comment 1747981-1
HDMI Receptacle, Pitch 0.5 mm, 19 Position, Height 6.38 mm, RoHS, Tape and Reel; Manufacturer: TE Connectivity; Gender: Female; Connector Type: Display; Voltage Rating: 40V; Package Reference: 1747981-1; Packaging: TapeandReel; Colour: Silver; Datasheet Version: Rev. F5, 12/2015; Case/Package: Metal; Contact Plating: Gold; Package Description: HDMI Receptacle, Pitch 0.5 mm, 19 Position, Height 6.38 mm; RoHS Compliant: True; Manufacturer URL: http://www.te.com/; Contact Material: Copper; Package Quantity: 300; Pins: 19; Lead Pitch: 0.5mm; Datasheet URL: http://www.te.com/commerce/DocumentDelivery/DDEController?Action=showdoc&DocId=Customer+Drawing%7F1747981%7FF5%7Fpdf%7FEnglish%7FENG_CD_1747981_F5.pdf%7F1747981-1; Mounting Technology: SM
footprint TE-1747981-1_V (Connector, 19-Leads, Body 11.55x15mm, Pitch 0.5mm)
pins: 1 TMDS DATA2+, 2 TMDS DATA2 SHIELD, 3 TMDS DATA2-, 4 TMDS DATA1+, 5 TMDS DATA1 SHIELD, 6 TMDS DATA1-, 7 TMDS DATA0+, 8 TMDS DATA0 SHIELD, 9 TMDS DATA0-, 10 TMDS CLOCK+, 11 TMDS CLOCK SHIELD, 12 TMDS CLOCK-, 13 CEC, 14 N.C., 15 SCL, 16 SDA, 17 DDC/CEC GROUND, 18 +5V POWER, 19 HOT PLUG DETECT, 20 SHLD1, 21 SHLD2, 22 SHLD3, 23 SHLD4
text: HDMI

## CMP-002-00013-2
designator J?, comment RASM722X
Power Jack, 5 A, 250 V, 3-Pin SMD, RoHS, Bulk; Manufacturer: Switchcraft; Connector Type: DCJack; Package Reference: RASM722X; Mounting Technology: SM; Manufacturer URL: http://www.switchcraft.com/; Datasheet URL: http://www.switchcraft.com/Drawings/rasm732x_cd.pdf; RoHS Compliant: Unknown; Datasheet Version: Rev. A, 09/2005; Package Description: 3-Pin Surface Mount Device, Body 14.5 x 9 mm; Case/Package: RASM722X
footprint SWIT-RASM722X_V (SMD, 3-Leads, Body 14.5x9mm)
pins: 1 SLEEVE, 2 TIP, 3 SHUNT

## CMP-002-00014-2
designator P?, comment 1803277
Male Header, Pitch 3.81 mm, 1 x 2 Position, Height 7.25 mm, Tail Length 3.4 mm, RoHS, Bulk; Manufacturer: Phoenix Contact; Voltage Rating: 160V; Current Rating: 8A; Rows: 1; Mounting Technology: TH; Contact Plating: Tin; Case/Package: 1803277; Gender: Male; Diameter: 7.25mm; Datasheet Version: Feb-14; Colour: Green; Pins: 2; Lead Pitch: 0.15inch; Connector Type: Header; Package Quantity: 50; Max Current Rating: 8A; Manufacturer URL: http://www.phoenixcontact.com/; Packaging: Bulk; RoHS Compliant: True; Datasheet URL: https://datasheet.ciiva.com/16096/1803277-16096845.pdf; Package Reference: 1803277; Package Description: Male Header, Pitch 3.81 mm, 1 x 2 Position, Height 7.25 mm, Tail Length 3.4 mm
footprint PHOE-1803277_V (CONN, Body 9.2x9.01mm, Pitch 3.81mm)
pins: 1, 2

## CMP-002-00015-2
designator P?, comment 2340-6111TG
Male Header, Pitch 2.54 mm, 1 x 40 Position, Height 8.636 mm, Tail Length 3.05 mm, -55 to 105 degC, RoHS, Bulk; Manufacturer: 3M; Max Current Rating: 3A; Rows: 1; Max Operating Temperature: 105°C; RoHS Compliant: True; Manufacturer URL: http://www.3m.com/; Package Reference: 2340-6111TG; Package Quantity: 200; Min Operating Temperature: -55°C; Package Description: Male Header, Pitch 2.54 mm, 1 x 40 Position, Height 8.636 mm, Tail Length 3.05 mm; Gender: Male; Datasheet URL: https://datasheet.ciiva.com/5161/ts0766-242217-5161112.pdf; Packaging: Bulk; Lead Pitch: 0.1inch; Mounting Technology: TH; Case/Package: 2340-6111TG; Connector Type: Header; Datasheet Version: Aug-08; Pins: 40; Current Rating: 3A; Contact Finish: Gold; Contact Plating: Gold; Colour: Black; Contact Material: Copper
footprint 3M-2340-6111TG_V (THD, 40-Leads, Body 101.6x2.54mm, Pitch 2.54mm)
pins: 1, 2, 3, 4, 5, 6, 7, 8, 9, 10, 11, 12, 13, 14, 15, 16, 17, 18, 19, 20, 21, 22, 23, 24, 25, 26, 27, 28, 29, 30, 31, 32, 33, 34, 35, 36, 37, 38, 39, 40

## CMP-002-00016-2
designator P?, comment 4-103741-0
Male Header, Pitch 2.54 mm, 1 x 40 Position, Height 8.128 mm, Tail Length 2.286 mm, RoHS, Bulk; Manufacturer: TE Connectivity; Max Contact Resistance: 20mohm; Rows: 1; Current Rating: 3A; Max Current Rating: 1A; Contact Finish: Lead; Colour: Black; Package Reference: 4-103741-0; Contact Gender: Male; Packaging: Bulk; Contact Material: Bronze; Datasheet URL: http://sigma.octopart.com/12533693/technical_drawing/Agastat-4-103741-0.pdf; Package Description: Male Header, Pitch 2.54 mm, 1 x 40 Position, Height 8.128 mm, Tail Length 2.286 mm; Mounting Technology: TH; RoHS Compliant: True; Pins: 40; Gender: Male; Package Quantity: 100; Max Operating Temperature: 105°C; Min Operating Temperature: -65°C; Manufacturer URL: http://www.te.com/; Case/Package: 4-103741-0; Lead Pitch: 0.1inch; Contact Plating: Tin; Datasheet Version: Mar-11; Connector Type: Header
footprint TECO-4-103741-0_V (THD, 40-Leads, Body 101.194x2.337mm, Pitch 2.54mm)
pins: 1, 2, 3, 4, 5, 6, 7, 8, 9, 10, 11, 12, 13, 14, 15, 16, 17, 18, 19, 20, 21, 22, 23, 24, 25, 26, 27, 28, 29, 30, 31, 32, 33, 34, 35, 36, 37, 38, 39, 40
